# Altium footprint library Package_SO.PcbLib: 333 footprints (part 20 of 21)
Each footprint in its own frame and in the unit in brackets; x right, y up, seen from the top. Pads: shape width x height; smd on the part's side, far side on the other; paste and mask are expansions set on the pad; w line width, h text height; cw(c..) or ccw(c..) is an arc to the next point about the centre after c.
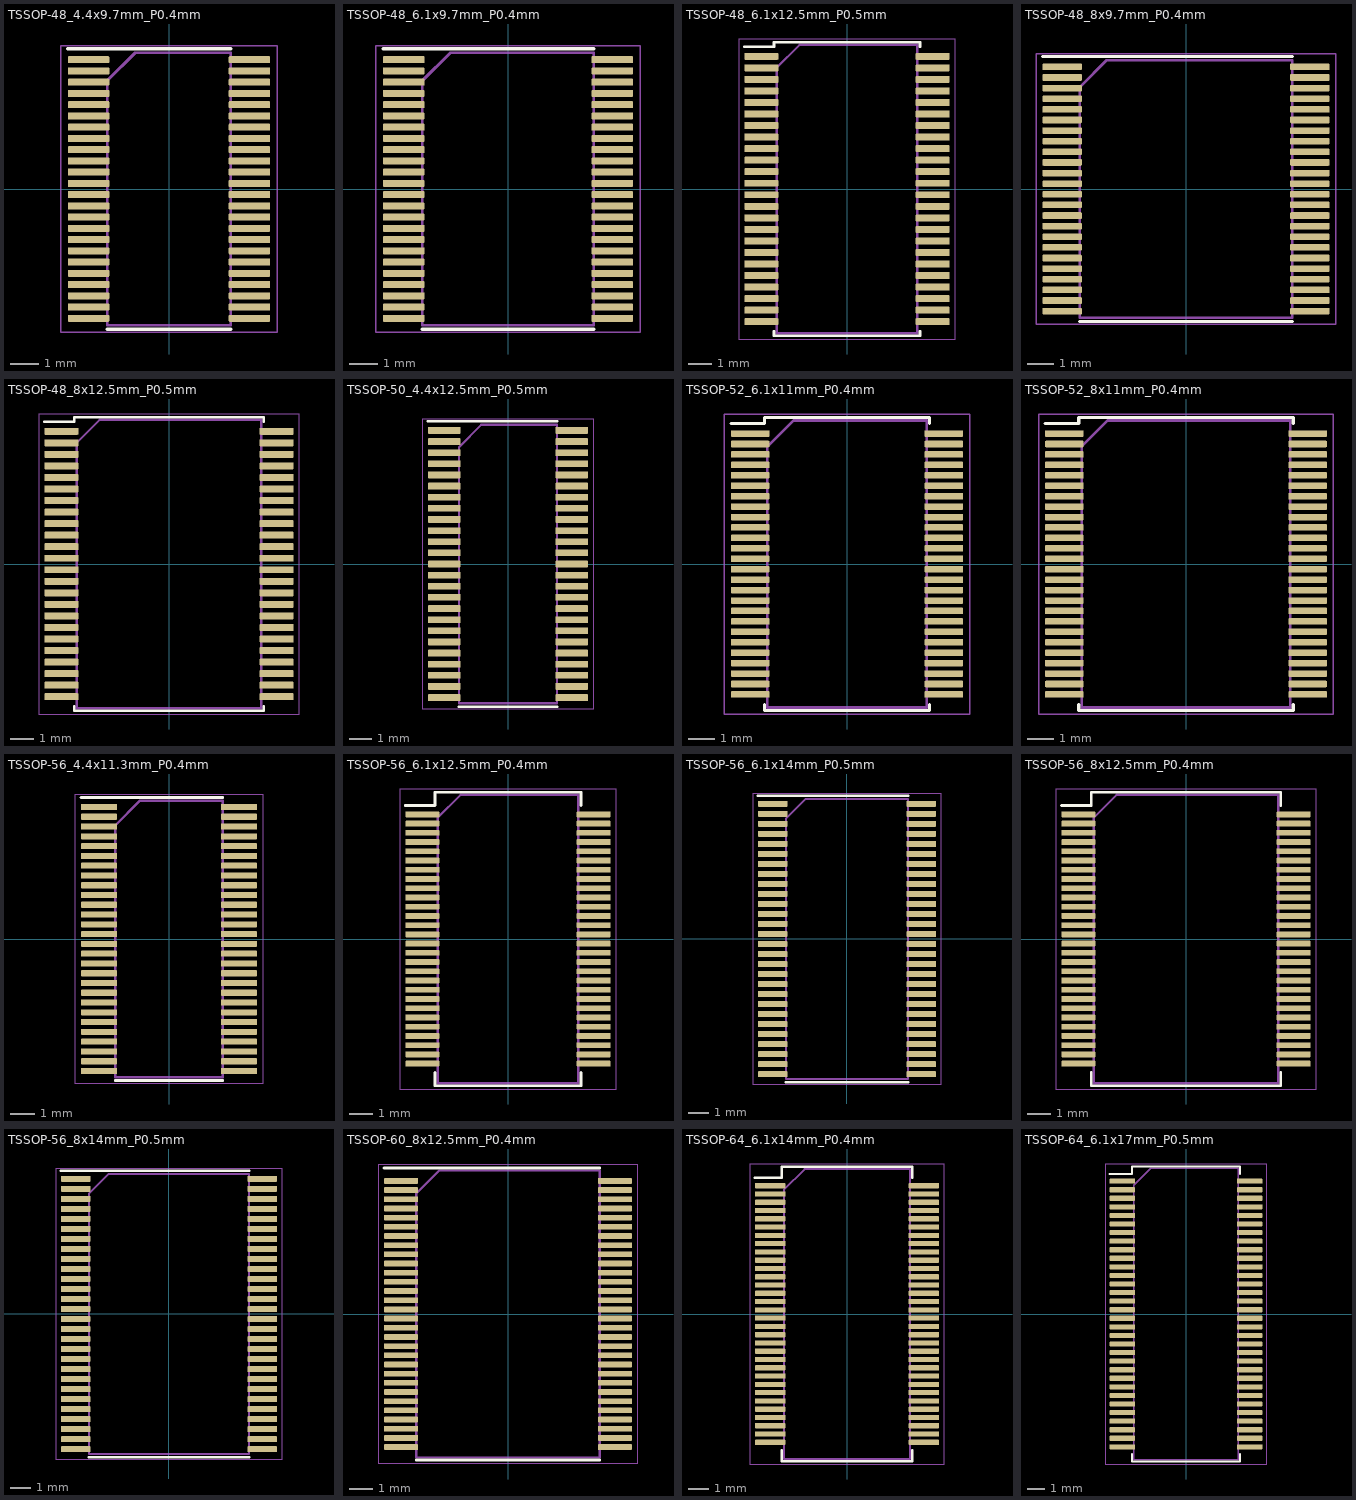
[diagram p19: the footprints below, top view; thin cyan lines are the x and y axes]

## TSSOP-48_4.4x9.7mm_P0.4mm [mm]
pads (48):
  rrect25% 1.475x0.25 smd: 1(-2.863,4.6) 2(-2.863,4.2) 3(-2.863,3.8) 4(-2.863,3.4) 5(-2.863,3) 6(-2.863,2.6) 7(-2.863,2.2) 8(-2.863,1.8) 9(-2.863,1.4) 10(-2.863,1) 11(-2.863,0.6) 12(-2.863,0.2) 13(-2.863,-0.2) 14(-2.863,-0.6) 15(-2.863,-1) 16(-2.863,-1.4) 17(-2.863,-1.8) 18(-2.863,-2.2) 19(-2.863,-2.6) 20(-2.863,-3) 21(-2.863,-3.4) 22(-2.863,-3.8) 23(-2.863,-4.2) 24(-2.863,-4.6) 25(2.863,-4.6) 26(2.863,-4.2) 27(2.863,-3.8) 28(2.863,-3.4) 29(2.863,-3) 30(2.863,-2.6) 31(2.863,-2.2) 32(2.863,-1.8) 33(2.863,-1.4) 34(2.863,-1) 35(2.863,-0.6) 36(2.863,-0.2) 37(2.863,0.2) 38(2.863,0.6) 39(2.863,1) 40(2.863,1.4) 41(2.863,1.8) 42(2.863,2.2) 43(2.863,2.6) 44(2.863,3) 45(2.863,3.4) 46(2.863,3.8) 47(2.863,4.2) 48(2.863,4.6)
F.SilkS:
  lines w0.12: -3.6,4.985 0,4.985 2.2,4.985 ; -2.2,-4.985 0,-4.985 2.2,-4.985
F.CrtYd:
  lines w0.05: -3.85,-5.1 3.85,-5.1 3.85,5.1 -3.85,5.1 -3.85,-5.1
F.Fab:
  lines w0.1: -2.2,-4.85 -2.2,3.85 -1.2,4.85 2.2,4.85 2.2,-4.85 -2.2,-4.85
  text "'.Designator'" at -4.047,-0.84 h1

## TSSOP-48_6.1x9.7mm_P0.4mm [mm]
pads (48):
  rrect25% 1.475x0.25 smd: 1(-3.712,4.6) 2(-3.712,4.2) 3(-3.712,3.8) 4(-3.712,3.4) 5(-3.712,3) 6(-3.712,2.6) 7(-3.712,2.2) 8(-3.712,1.8) 9(-3.712,1.4) 10(-3.712,1) 11(-3.712,0.6) 12(-3.712,0.2) 13(-3.712,-0.2) 14(-3.712,-0.6) 15(-3.712,-1) 16(-3.712,-1.4) 17(-3.712,-1.8) 18(-3.712,-2.2) 19(-3.712,-2.6) 20(-3.712,-3) 21(-3.712,-3.4) 22(-3.712,-3.8) 23(-3.712,-4.2) 24(-3.712,-4.6) 25(3.712,-4.6) 26(3.712,-4.2) 27(3.712,-3.8) 28(3.712,-3.4) 29(3.712,-3) 30(3.712,-2.6) 31(3.712,-2.2) 32(3.712,-1.8) 33(3.712,-1.4) 34(3.712,-1) 35(3.712,-0.6) 36(3.712,-0.2) 37(3.712,0.2) 38(3.712,0.6) 39(3.712,1) 40(3.712,1.4) 41(3.712,1.8) 42(3.712,2.2) 43(3.712,2.6) 44(3.712,3) 45(3.712,3.4) 46(3.712,3.8) 47(3.712,4.2) 48(3.712,4.6)
F.SilkS:
  lines w0.12: -4.45,4.985 0,4.985 3.05,4.985 ; -3.05,-4.985 0,-4.985 3.05,-4.985
F.CrtYd:
  lines w0.05: -4.7,-5.1 4.7,-5.1 4.7,5.1 -4.7,5.1 -4.7,-5.1
F.Fab:
  lines w0.1: -3.05,-4.85 -3.05,3.85 -2.05,4.85 3.05,4.85 3.05,-4.85 -3.05,-4.85
  text "'.Designator'" at -4.047,-0.84 h1

## TSSOP-48_6.1x12.5mm_P0.5mm [mm]
pads (48):
  rrect25% 1.475x0.3 smd: 1(-3.712,5.75) 2(-3.712,5.25) 3(-3.712,4.75) 4(-3.712,4.25) 5(-3.712,3.75) 6(-3.712,3.25) 7(-3.712,2.75) 8(-3.712,2.25) 9(-3.712,1.75) 10(-3.712,1.25) 11(-3.712,0.75) 12(-3.712,0.25) 13(-3.712,-0.25) 14(-3.712,-0.75) 15(-3.712,-1.25) 16(-3.712,-1.75) 17(-3.712,-2.25) 18(-3.712,-2.75) 19(-3.712,-3.25) 20(-3.712,-3.75) 21(-3.712,-4.25) 22(-3.712,-4.75) 23(-3.712,-5.25) 24(-3.712,-5.75) 25(3.712,-5.75) 26(3.712,-5.25) 27(3.712,-4.75) 28(3.712,-4.25) 29(3.712,-3.75) 30(3.712,-3.25) 31(3.712,-2.75) 32(3.712,-2.25) 33(3.712,-1.75) 34(3.712,-1.25) 35(3.712,-0.75) 36(3.712,-0.25) 37(3.712,0.25) 38(3.712,0.75) 39(3.712,1.25) 40(3.712,1.75) 41(3.712,2.25) 42(3.712,2.75) 43(3.712,3.25) 44(3.712,3.75) 45(3.712,4.25) 46(3.712,4.75) 47(3.712,5.25) 48(3.712,5.75)
F.SilkS:
  lines w0.12: -4.45,6.16 -3.16,6.16 -3.16,6.36 0,6.36 3.16,6.36 3.16,6.16 ; -3.16,-6.16 -3.16,-6.36 0,-6.36 3.16,-6.36 3.16,-6.16
F.CrtYd:
  lines w0.05: -4.7,-6.5 4.7,-6.5 4.7,6.5 -4.7,6.5 -4.7,-6.5
F.Fab:
  lines w0.1: -3.05,-6.25 -3.05,5.25 -2.05,6.25 3.05,6.25 3.05,-6.25 -3.05,-6.25
  text "'.Designator'" at -4.047,-0.84 h1

## TSSOP-48_8x9.7mm_P0.4mm [mm]
pads (48):
  rrect25% 1.475x0.25 smd: 1(-4.663,4.6) 2(-4.663,4.2) 3(-4.663,3.8) 4(-4.663,3.4) 5(-4.663,3) 6(-4.663,2.6) 7(-4.663,2.2) 8(-4.663,1.8) 9(-4.663,1.4) 10(-4.663,1) 11(-4.663,0.6) 12(-4.663,0.2) 13(-4.663,-0.2) 14(-4.663,-0.6) 15(-4.663,-1) 16(-4.663,-1.4) 17(-4.663,-1.8) 18(-4.663,-2.2) 19(-4.663,-2.6) 20(-4.663,-3) 21(-4.663,-3.4) 22(-4.663,-3.8) 23(-4.663,-4.2) 24(-4.663,-4.6) 25(4.663,-4.6) 26(4.663,-4.2) 27(4.663,-3.8) 28(4.663,-3.4) 29(4.663,-3) 30(4.663,-2.6) 31(4.663,-2.2) 32(4.663,-1.8) 33(4.663,-1.4) 34(4.663,-1) 35(4.663,-0.6) 36(4.663,-0.2) 37(4.663,0.2) 38(4.663,0.6) 39(4.663,1) 40(4.663,1.4) 41(4.663,1.8) 42(4.663,2.2) 43(4.663,2.6) 44(4.663,3) 45(4.663,3.4) 46(4.663,3.8) 47(4.663,4.2) 48(4.663,4.6)
F.SilkS:
  lines w0.12: -5.4,4.985 0,4.985 4,4.985 ; -4,-4.985 0,-4.985 4,-4.985
F.CrtYd:
  lines w0.05: -5.65,-5.1 -5.65,5.1 5.65,5.1 5.65,-5.1 -5.65,-5.1
F.Fab:
  lines w0.1: -4,-4.85 -4,3.85 -3,4.85 4,4.85 4,-4.85 -4,-4.85
  text "'.Designator'" at -4.047,-0.84 h1

## TSSOP-48_8x12.5mm_P0.5mm [mm]
pads (48):
  rrect25% 1.475x0.3 smd: 1(-4.663,5.75) 2(-4.663,5.25) 3(-4.663,4.75) 4(-4.663,4.25) 5(-4.663,3.75) 6(-4.663,3.25) 7(-4.663,2.75) 8(-4.663,2.25) 9(-4.663,1.75) 10(-4.663,1.25) 11(-4.663,0.75) 12(-4.663,0.25) 13(-4.663,-0.25) 14(-4.663,-0.75) 15(-4.663,-1.25) 16(-4.663,-1.75) 17(-4.663,-2.25) 18(-4.663,-2.75) 19(-4.663,-3.25) 20(-4.663,-3.75) 21(-4.663,-4.25) 22(-4.663,-4.75) 23(-4.663,-5.25) 24(-4.663,-5.75) 25(4.663,-5.75) 26(4.663,-5.25) 27(4.663,-4.75) 28(4.663,-4.25) 29(4.663,-3.75) 30(4.663,-3.25) 31(4.663,-2.75) 32(4.663,-2.25) 33(4.663,-1.75) 34(4.663,-1.25) 35(4.663,-0.75) 36(4.663,-0.25) 37(4.663,0.25) 38(4.663,0.75) 39(4.663,1.25) 40(4.663,1.75) 41(4.663,2.25) 42(4.663,2.75) 43(4.663,3.25) 44(4.663,3.75) 45(4.663,4.25) 46(4.663,4.75) 47(4.663,5.25) 48(4.663,5.75)
F.SilkS:
  lines w0.12: -5.4,6.16 -4.11,6.16 -4.11,6.36 0,6.36 4.11,6.36 4.11,6.16 ; -4.11,-6.16 -4.11,-6.36 0,-6.36 4.11,-6.36 4.11,-6.16
F.CrtYd:
  lines w0.05: -5.65,-6.5 5.65,-6.5 5.65,6.5 -5.65,6.5 -5.65,-6.5
F.Fab:
  lines w0.1: -4,-6.25 -4,5.25 -3,6.25 4,6.25 4,-6.25 -4,-6.25
  text "'.Designator'" at -4.047,-0.84 h1

## TSSOP-50_4.4x12.5mm_P0.5mm [mm]
pads (50):
  rrect25% 1.475x0.3 smd: 1(-2.863,6) 2(-2.863,5.5) 3(-2.863,5) 4(-2.863,4.5) 5(-2.863,4) 6(-2.863,3.5) 7(-2.863,3) 8(-2.863,2.5) 9(-2.863,2) 10(-2.863,1.5) 11(-2.863,1) 12(-2.863,0.5) 13(-2.863,0) 14(-2.863,-0.5) 15(-2.863,-1) 16(-2.863,-1.5) 17(-2.863,-2) 18(-2.863,-2.5) 19(-2.863,-3) 20(-2.863,-3.5) 21(-2.863,-4) 22(-2.863,-4.5) 23(-2.863,-5) 24(-2.863,-5.5) 25(-2.863,-6) 26(2.863,-6) 27(2.863,-5.5) 28(2.863,-5) 29(2.863,-4.5) 30(2.863,-4) 31(2.863,-3.5) 32(2.863,-3) 33(2.863,-2.5) 34(2.863,-2) 35(2.863,-1.5) 36(2.863,-1) 37(2.863,-0.5) 38(2.863,0) 39(2.863,0.5) 40(2.863,1) 41(2.863,1.5) 42(2.863,2) 43(2.863,2.5) 44(2.863,3) 45(2.863,3.5) 46(2.863,4) 47(2.863,4.5) 48(2.863,5) 49(2.863,5.5) 50(2.863,6)
F.SilkS:
  lines w0.12: -3.6,6.41 0,6.41 2.2,6.41 ; -2.2,-6.41 0,-6.41 2.2,-6.41
F.CrtYd:
  lines w0.05: -3.85,-6.5 3.85,-6.5 3.85,6.5 -3.85,6.5 -3.85,-6.5
F.Fab:
  lines w0.1: -2.2,-6.25 -2.2,5.25 -1.2,6.25 2.2,6.25 2.2,-6.25 -2.2,-6.25
  text "'.Designator'" at -4.047,-0.84 h1

## TSSOP-52_6.1x11mm_P0.4mm [mm]
pads (52):
  rrect25% 1.475x0.25 smd: 1(-3.712,5) 2(-3.712,4.6) 3(-3.712,4.2) 4(-3.712,3.8) 5(-3.712,3.4) 6(-3.712,3) 7(-3.712,2.6) 8(-3.712,2.2) 9(-3.712,1.8) 10(-3.712,1.4) 11(-3.712,1) 12(-3.712,0.6) 13(-3.712,0.2) 14(-3.712,-0.2) 15(-3.712,-0.6) 16(-3.712,-1) 17(-3.712,-1.4) 18(-3.712,-1.8) 19(-3.712,-2.2) 20(-3.712,-2.6) 21(-3.712,-3) 22(-3.712,-3.4) 23(-3.712,-3.8) 24(-3.712,-4.2) 25(-3.712,-4.6) 26(-3.712,-5) 27(3.712,-5) 28(3.712,-4.6) 29(3.712,-4.2) 30(3.712,-3.8) 31(3.712,-3.4) 32(3.712,-3) 33(3.712,-2.6) 34(3.712,-2.2) 35(3.712,-1.8) 36(3.712,-1.4) 37(3.712,-1) 38(3.712,-0.6) 39(3.712,-0.2) 40(3.712,0.2) 41(3.712,0.6) 42(3.712,1) 43(3.712,1.4) 44(3.712,1.8) 45(3.712,2.2) 46(3.712,2.6) 47(3.712,3) 48(3.712,3.4) 49(3.712,3.8) 50(3.712,4.2) 51(3.712,4.6) 52(3.712,5)
F.SilkS:
  lines w0.12: -4.45,5.385 -3.16,5.385 -3.16,5.61 0,5.61 3.16,5.61 3.16,5.385 ; -3.16,-5.385 -3.16,-5.61 0,-5.61 3.16,-5.61 3.16,-5.385
F.CrtYd:
  lines w0.05: -4.7,-5.75 4.7,-5.75 4.7,5.75 -4.7,5.75 -4.7,-5.75
F.Fab:
  lines w0.1: -3.05,-5.5 -3.05,4.5 -2.05,5.5 3.05,5.5 3.05,-5.5 -3.05,-5.5
  text "'.Designator'" at -4.047,-0.84 h1

## TSSOP-52_8x11mm_P0.4mm [mm]
pads (52):
  rrect25% 1.475x0.25 smd: 1(-4.663,5) 2(-4.663,4.6) 3(-4.663,4.2) 4(-4.663,3.8) 5(-4.663,3.4) 6(-4.663,3) 7(-4.663,2.6) 8(-4.663,2.2) 9(-4.663,1.8) 10(-4.663,1.4) 11(-4.663,1) 12(-4.663,0.6) 13(-4.663,0.2) 14(-4.663,-0.2) 15(-4.663,-0.6) 16(-4.663,-1) 17(-4.663,-1.4) 18(-4.663,-1.8) 19(-4.663,-2.2) 20(-4.663,-2.6) 21(-4.663,-3) 22(-4.663,-3.4) 23(-4.663,-3.8) 24(-4.663,-4.2) 25(-4.663,-4.6) 26(-4.663,-5) 27(4.663,-5) 28(4.663,-4.6) 29(4.663,-4.2) 30(4.663,-3.8) 31(4.663,-3.4) 32(4.663,-3) 33(4.663,-2.6) 34(4.663,-2.2) 35(4.663,-1.8) 36(4.663,-1.4) 37(4.663,-1) 38(4.663,-0.6) 39(4.663,-0.2) 40(4.663,0.2) 41(4.663,0.6) 42(4.663,1) 43(4.663,1.4) 44(4.663,1.8) 45(4.663,2.2) 46(4.663,2.6) 47(4.663,3) 48(4.663,3.4) 49(4.663,3.8) 50(4.663,4.2) 51(4.663,4.6) 52(4.663,5)
F.SilkS:
  lines w0.12: -5.4,5.385 -4.11,5.385 -4.11,5.61 0,5.61 4.11,5.61 4.11,5.385 ; -4.11,-5.385 -4.11,-5.61 0,-5.61 4.11,-5.61 4.11,-5.385
F.CrtYd:
  lines w0.05: -5.65,-5.75 -5.65,5.75 5.65,5.75 5.65,-5.75 -5.65,-5.75
F.Fab:
  lines w0.1: -4,-5.5 4,-5.5 4,5.5 -3,5.5 -4,4.5 -4,-5.5
  text "'.Designator'" at -4.047,-0.84 h1

## TSSOP-56_4.4x11.3mm_P0.4mm [mm]
pads (56):
  rrect25% 1.475x0.25 smd: 1(-2.863,5.4) 2(-2.863,5) 3(-2.863,4.6) 4(-2.863,4.2) 5(-2.863,3.8) 6(-2.863,3.4) 7(-2.863,3) 8(-2.863,2.6) 9(-2.863,2.2) 10(-2.863,1.8) 11(-2.863,1.4) 12(-2.863,1) 13(-2.863,0.6) 14(-2.863,0.2) 15(-2.863,-0.2) 16(-2.863,-0.6) 17(-2.863,-1) 18(-2.863,-1.4) 19(-2.863,-1.8) 20(-2.863,-2.2) 21(-2.863,-2.6) 22(-2.863,-3) 23(-2.863,-3.4) 24(-2.863,-3.8) 25(-2.863,-4.2) 26(-2.863,-4.6) 27(-2.863,-5) 28(-2.863,-5.4) 29(2.863,-5.4) 30(2.863,-5) 31(2.863,-4.6) 32(2.863,-4.2) 33(2.863,-3.8) 34(2.863,-3.4) 35(2.863,-3) 36(2.863,-2.6) 37(2.863,-2.2) 38(2.863,-1.8) 39(2.863,-1.4) 40(2.863,-1) 41(2.863,-0.6) 42(2.863,-0.2) 43(2.863,0.2) 44(2.863,0.6) 45(2.863,1) 46(2.863,1.4) 47(2.863,1.8) 48(2.863,2.2) 49(2.863,2.6) 50(2.863,3) 51(2.863,3.4) 52(2.863,3.8) 53(2.863,4.2) 54(2.863,4.6) 55(2.863,5) 56(2.863,5.4)
F.SilkS:
  lines w0.12: -3.6,5.785 0,5.785 2.2,5.785 ; -2.2,-5.785 0,-5.785 2.2,-5.785
F.CrtYd:
  lines w0.05: -3.85,-5.9 3.85,-5.9 3.85,5.9 -3.85,5.9 -3.85,-5.9
F.Fab:
  lines w0.1: -2.2,-5.65 -2.2,4.65 -1.2,5.65 2.2,5.65 2.2,-5.65 -2.2,-5.65
  text "'.Designator'" at -4.047,-0.84 h1

## TSSOP-56_6.1x12.5mm_P0.4mm [mm]
pads (56):
  rrect25% 1.475x0.25 smd: 1(-3.712,5.4) 2(-3.712,5) 3(-3.712,4.6) 4(-3.712,4.2) 5(-3.712,3.8) 6(-3.712,3.4) 7(-3.712,3) 8(-3.712,2.6) 9(-3.712,2.2) 10(-3.712,1.8) 11(-3.712,1.4) 12(-3.712,1) 13(-3.712,0.6) 14(-3.712,0.2) 15(-3.712,-0.2) 16(-3.712,-0.6) 17(-3.712,-1) 18(-3.712,-1.4) 19(-3.712,-1.8) 20(-3.712,-2.2) 21(-3.712,-2.6) 22(-3.712,-3) 23(-3.712,-3.4) 24(-3.712,-3.8) 25(-3.712,-4.2) 26(-3.712,-4.6) 27(-3.712,-5) 28(-3.712,-5.4) 29(3.712,-5.4) 30(3.712,-5) 31(3.712,-4.6) 32(3.712,-4.2) 33(3.712,-3.8) 34(3.712,-3.4) 35(3.712,-3) 36(3.712,-2.6) 37(3.712,-2.2) 38(3.712,-1.8) 39(3.712,-1.4) 40(3.712,-1) 41(3.712,-0.6) 42(3.712,-0.2) 43(3.712,0.2) 44(3.712,0.6) 45(3.712,1) 46(3.712,1.4) 47(3.712,1.8) 48(3.712,2.2) 49(3.712,2.6) 50(3.712,3) 51(3.712,3.4) 52(3.712,3.8) 53(3.712,4.2) 54(3.712,4.6) 55(3.712,5) 56(3.712,5.4)
F.SilkS:
  lines w0.12: -4.45,5.785 -3.16,5.785 -3.16,6.36 0,6.36 3.16,6.36 3.16,5.785 ; -3.16,-5.785 -3.16,-6.36 0,-6.36 3.16,-6.36 3.16,-5.785
F.CrtYd:
  lines w0.05: -4.7,-6.5 4.7,-6.5 4.7,6.5 -4.7,6.5 -4.7,-6.5
F.Fab:
  lines w0.1: -3.05,-6.25 -3.05,5.25 -2.05,6.25 3.05,6.25 3.05,-6.25 -3.05,-6.25
  text "'.Designator'" at -4.047,-0.84 h1

## TSSOP-56_6.1x14mm_P0.5mm [mm]
pads (56):
  rrect25% 1.475x0.3 smd: 1(-3.712,6.75) 2(-3.712,6.25) 3(-3.712,5.75) 4(-3.712,5.25) 5(-3.712,4.75) 6(-3.712,4.25) 7(-3.712,3.75) 8(-3.712,3.25) 9(-3.712,2.75) 10(-3.712,2.25) 11(-3.712,1.75) 12(-3.712,1.25) 13(-3.712,0.75) 14(-3.712,0.25) 15(-3.712,-0.25) 16(-3.712,-0.75) 17(-3.712,-1.25) 18(-3.712,-1.75) 19(-3.712,-2.25) 20(-3.712,-2.75) 21(-3.712,-3.25) 22(-3.712,-3.75) 23(-3.712,-4.25) 24(-3.712,-4.75) 25(-3.712,-5.25) 26(-3.712,-5.75) 27(-3.712,-6.25) 28(-3.712,-6.75) 29(3.712,-6.75) 30(3.712,-6.25) 31(3.712,-5.75) 32(3.712,-5.25) 33(3.712,-4.75) 34(3.712,-4.25) 35(3.712,-3.75) 36(3.712,-3.25) 37(3.712,-2.75) 38(3.712,-2.25) 39(3.712,-1.75) 40(3.712,-1.25) 41(3.712,-0.75) 42(3.712,-0.25) 43(3.712,0.25) 44(3.712,0.75) 45(3.712,1.25) 46(3.712,1.75) 47(3.712,2.25) 48(3.712,2.75) 49(3.712,3.25) 50(3.712,3.75) 51(3.712,4.25) 52(3.712,4.75) 53(3.712,5.25) 54(3.712,5.75) 55(3.712,6.25) 56(3.712,6.75)
F.SilkS:
  lines w0.12: -4.45,7.16 0,7.16 3.05,7.16 ; -3.05,-7.16 0,-7.16 3.05,-7.16
F.CrtYd:
  lines w0.05: -4.7,-7.25 4.7,-7.25 4.7,7.25 -4.7,7.25 -4.7,-7.25
F.Fab:
  lines w0.1: -3.05,-7 3.05,-7 3.05,7 -2.05,7 -3.05,6 -3.05,-7
  text "'.Designator'" at -4.047,-0.84 h1

## TSSOP-56_8x12.5mm_P0.4mm [mm]
pads (56):
  rrect25% 1.475x0.25 smd: 1(-4.663,5.4) 2(-4.663,5) 3(-4.663,4.6) 4(-4.663,4.2) 5(-4.663,3.8) 6(-4.663,3.4) 7(-4.663,3) 8(-4.663,2.6) 9(-4.663,2.2) 10(-4.663,1.8) 11(-4.663,1.4) 12(-4.663,1) 13(-4.663,0.6) 14(-4.663,0.2) 15(-4.663,-0.2) 16(-4.663,-0.6) 17(-4.663,-1) 18(-4.663,-1.4) 19(-4.663,-1.8) 20(-4.663,-2.2) 21(-4.663,-2.6) 22(-4.663,-3) 23(-4.663,-3.4) 24(-4.663,-3.8) 25(-4.663,-4.2) 26(-4.663,-4.6) 27(-4.663,-5) 28(-4.663,-5.4) 29(4.663,-5.4) 30(4.663,-5) 31(4.663,-4.6) 32(4.663,-4.2) 33(4.663,-3.8) 34(4.663,-3.4) 35(4.663,-3) 36(4.663,-2.6) 37(4.663,-2.2) 38(4.663,-1.8) 39(4.663,-1.4) 40(4.663,-1) 41(4.663,-0.6) 42(4.663,-0.2) 43(4.663,0.2) 44(4.663,0.6) 45(4.663,1) 46(4.663,1.4) 47(4.663,1.8) 48(4.663,2.2) 49(4.663,2.6) 50(4.663,3) 51(4.663,3.4) 52(4.663,3.8) 53(4.663,4.2) 54(4.663,4.6) 55(4.663,5) 56(4.663,5.4)
F.SilkS:
  lines w0.12: -5.4,5.785 -4.11,5.785 -4.11,6.36 0,6.36 4.11,6.36 4.11,5.785 ; -4.11,-5.785 -4.11,-6.36 0,-6.36 4.11,-6.36 4.11,-5.785
F.CrtYd:
  lines w0.05: -5.65,-6.5 5.65,-6.5 5.65,6.5 -5.65,6.5 -5.65,-6.5
F.Fab:
  lines w0.1: -4,-6.25 -4,5.25 -3,6.25 4,6.25 4,-6.25 -4,-6.25
  text "'.Designator'" at -4.047,-0.84 h1

## TSSOP-56_8x14mm_P0.5mm [mm]
pads (56):
  rrect25% 1.475x0.3 smd: 1(-4.663,6.75) 2(-4.663,6.25) 3(-4.663,5.75) 4(-4.663,5.25) 5(-4.663,4.75) 6(-4.663,4.25) 7(-4.663,3.75) 8(-4.663,3.25) 9(-4.663,2.75) 10(-4.663,2.25) 11(-4.663,1.75) 12(-4.663,1.25) 13(-4.663,0.75) 14(-4.663,0.25) 15(-4.663,-0.25) 16(-4.663,-0.75) 17(-4.663,-1.25) 18(-4.663,-1.75) 19(-4.663,-2.25) 20(-4.663,-2.75) 21(-4.663,-3.25) 22(-4.663,-3.75) 23(-4.663,-4.25) 24(-4.663,-4.75) 25(-4.663,-5.25) 26(-4.663,-5.75) 27(-4.663,-6.25) 28(-4.663,-6.75) 29(4.663,-6.75) 30(4.663,-6.25) 31(4.663,-5.75) 32(4.663,-5.25) 33(4.663,-4.75) 34(4.663,-4.25) 35(4.663,-3.75) 36(4.663,-3.25) 37(4.663,-2.75) 38(4.663,-2.25) 39(4.663,-1.75) 40(4.663,-1.25) 41(4.663,-0.75) 42(4.663,-0.25) 43(4.663,0.25) 44(4.663,0.75) 45(4.663,1.25) 46(4.663,1.75) 47(4.663,2.25) 48(4.663,2.75) 49(4.663,3.25) 50(4.663,3.75) 51(4.663,4.25) 52(4.663,4.75) 53(4.663,5.25) 54(4.663,5.75) 55(4.663,6.25) 56(4.663,6.75)
F.SilkS:
  lines w0.12: -5.4,7.16 0,7.16 4,7.16 ; -4,-7.16 0,-7.16 4,-7.16
F.CrtYd:
  lines w0.05: -5.65,-7.25 -5.65,7.25 5.65,7.25 5.65,-7.25 -5.65,-7.25
F.Fab:
  lines w0.1: -4,-7 -4,6 -3,7 4,7 4,-7 -4,-7
  text "'.Designator'" at -4.047,-0.84 h1

## TSSOP-60_8x12.5mm_P0.4mm [mm]
pads (60):
  rrect25% 1.475x0.25 smd: 1(-4.663,5.8) 2(-4.663,5.4) 3(-4.663,5) 4(-4.663,4.6) 5(-4.663,4.2) 6(-4.663,3.8) 7(-4.663,3.4) 8(-4.663,3) 9(-4.663,2.6) 10(-4.663,2.2) 11(-4.663,1.8) 12(-4.663,1.4) 13(-4.663,1) 14(-4.663,0.6) 15(-4.663,0.2) 16(-4.663,-0.2) 17(-4.663,-0.6) 18(-4.663,-1) 19(-4.663,-1.4) 20(-4.663,-1.8) 21(-4.663,-2.2) 22(-4.663,-2.6) 23(-4.663,-3) 24(-4.663,-3.4) 25(-4.663,-3.8) 26(-4.663,-4.2) 27(-4.663,-4.6) 28(-4.663,-5) 29(-4.663,-5.4) 30(-4.663,-5.8) 31(4.663,-5.8) 32(4.663,-5.4) 33(4.663,-5) 34(4.663,-4.6) 35(4.663,-4.2) 36(4.663,-3.8) 37(4.663,-3.4) 38(4.663,-3) 39(4.663,-2.6) 40(4.663,-2.2) 41(4.663,-1.8) 42(4.663,-1.4) 43(4.663,-1) 44(4.663,-0.6) 45(4.663,-0.2) 46(4.663,0.2) 47(4.663,0.6) 48(4.663,1) 49(4.663,1.4) 50(4.663,1.8) 51(4.663,2.2) 52(4.663,2.6) 53(4.663,3) 54(4.663,3.4) 55(4.663,3.8) 56(4.663,4.2) 57(4.663,4.6) 58(4.663,5) 59(4.663,5.4) 60(4.663,5.8)
F.SilkS:
  lines w0.12: -5.4,6.36 0,6.36 4,6.36 ; -4,-6.36 0,-6.36 4,-6.36
F.CrtYd:
  lines w0.05: -5.65,-6.5 5.65,-6.5 5.65,6.5 -5.65,6.5 -5.65,-6.5
F.Fab:
  lines w0.1: -4,-6.25 4,-6.25 4,6.25 -3,6.25 -4,5.25 -4,-6.25
  text "'.Designator'" at -4.047,-0.84 h1

## TSSOP-64_6.1x14mm_P0.4mm [mm]
pads (64):
  rrect25% 1.475x0.25 smd: 1(-3.712,6.2) 2(-3.712,5.8) 3(-3.712,5.4) 4(-3.712,5) 5(-3.712,4.6) 6(-3.712,4.2) 7(-3.712,3.8) 8(-3.712,3.4) 9(-3.712,3) 10(-3.712,2.6) 11(-3.712,2.2) 12(-3.712,1.8) 13(-3.712,1.4) 14(-3.712,1) 15(-3.712,0.6) 16(-3.712,0.2) 17(-3.712,-0.2) 18(-3.712,-0.6) 19(-3.712,-1) 20(-3.712,-1.4) 21(-3.712,-1.8) 22(-3.712,-2.2) 23(-3.712,-2.6) 24(-3.712,-3) 25(-3.712,-3.4) 26(-3.712,-3.8) 27(-3.712,-4.2) 28(-3.712,-4.6) 29(-3.712,-5) 30(-3.712,-5.4) 31(-3.712,-5.8) 32(-3.712,-6.2) 33(3.712,-6.2) 34(3.712,-5.8) 35(3.712,-5.4) 36(3.712,-5) 37(3.712,-4.6) 38(3.712,-4.2) 39(3.712,-3.8) 40(3.712,-3.4) 41(3.712,-3) 42(3.712,-2.6) 43(3.712,-2.2) 44(3.712,-1.8) 45(3.712,-1.4) 46(3.712,-1) 47(3.712,-0.6) 48(3.712,-0.2) 49(3.712,0.2) 50(3.712,0.6) 51(3.712,1) 52(3.712,1.4) 53(3.712,1.8) 54(3.712,2.2) 55(3.712,2.6) 56(3.712,3) 57(3.712,3.4) 58(3.712,3.8) 59(3.712,4.2) 60(3.712,4.6) 61(3.712,5) 62(3.712,5.4) 63(3.712,5.8) 64(3.712,6.2)
F.SilkS:
  lines w0.12: -4.45,6.585 -3.16,6.585 -3.16,7.11 0,7.11 3.16,7.11 3.16,6.585 ; -3.16,-6.585 -3.16,-7.11 0,-7.11 3.16,-7.11 3.16,-6.585
F.CrtYd:
  lines w0.05: -4.7,-7.25 4.7,-7.25 4.7,7.25 -4.7,7.25 -4.7,-7.25
F.Fab:
  lines w0.1: -3.05,-7 3.05,-7 3.05,7 -2.05,7 -3.05,6 -3.05,-7
  text "'.Designator'" at -4.047,-0.84 h1

## TSSOP-64_6.1x17mm_P0.5mm [mm]
pads (64):
  rrect25% 1.475x0.3 smd: 1(-3.712,7.75) 2(-3.712,7.25) 3(-3.712,6.75) 4(-3.712,6.25) 5(-3.712,5.75) 6(-3.712,5.25) 7(-3.712,4.75) 8(-3.712,4.25) 9(-3.712,3.75) 10(-3.712,3.25) 11(-3.712,2.75) 12(-3.712,2.25) 13(-3.712,1.75) 14(-3.712,1.25) 15(-3.712,0.75) 16(-3.712,0.25) 17(-3.712,-0.25) 18(-3.712,-0.75) 19(-3.712,-1.25) 20(-3.712,-1.75) 21(-3.712,-2.25) 22(-3.712,-2.75) 23(-3.712,-3.25) 24(-3.712,-3.75) 25(-3.712,-4.25) 26(-3.712,-4.75) 27(-3.712,-5.25) 28(-3.712,-5.75) 29(-3.712,-6.25) 30(-3.712,-6.75) 31(-3.712,-7.25) 32(-3.712,-7.75) 33(3.712,-7.75) 34(3.712,-7.25) 35(3.712,-6.75) 36(3.712,-6.25) 37(3.712,-5.75) 38(3.712,-5.25) 39(3.712,-4.75) 40(3.712,-4.25) 41(3.712,-3.75) 42(3.712,-3.25) 43(3.712,-2.75) 44(3.712,-2.25) 45(3.712,-1.75) 46(3.712,-1.25) 47(3.712,-0.75) 48(3.712,-0.25) 49(3.712,0.25) 50(3.712,0.75) 51(3.712,1.25) 52(3.712,1.75) 53(3.712,2.25) 54(3.712,2.75) 55(3.712,3.25) 56(3.712,3.75) 57(3.712,4.25) 58(3.712,4.75) 59(3.712,5.25) 60(3.712,5.75) 61(3.712,6.25) 62(3.712,6.75) 63(3.712,7.25) 64(3.712,7.75)
F.SilkS:
  lines w0.12: -4.45,8.16 -3.16,8.16 -3.16,8.61 0,8.61 3.16,8.61 3.16,8.16 ; -3.16,-8.16 -3.16,-8.61 0,-8.61 3.16,-8.61 3.16,-8.16
F.CrtYd:
  lines w0.05: -4.7,-8.75 -4.7,8.75 4.7,8.75 4.7,-8.75 -4.7,-8.75
F.Fab:
  lines w0.1: -3.05,-8.5 -3.05,7.5 -2.05,8.5 3.05,8.5 3.05,-8.5 -3.05,-8.5
  text "'.Designator'" at -4.047,-0.84 h1